# Altium footprint library chipfc_libs.PCBLIB: 283 footprints (part 8 of 18)
Each footprint in its own frame and in the unit in brackets; x right, y up, seen from the top. Pads: shape width x height; smd on the part's side, far side on the other; paste and mask are expansions set on the pad; w line width, h text height; cw(c..) or ccw(c..) is an arc to the next point about the centre after c.
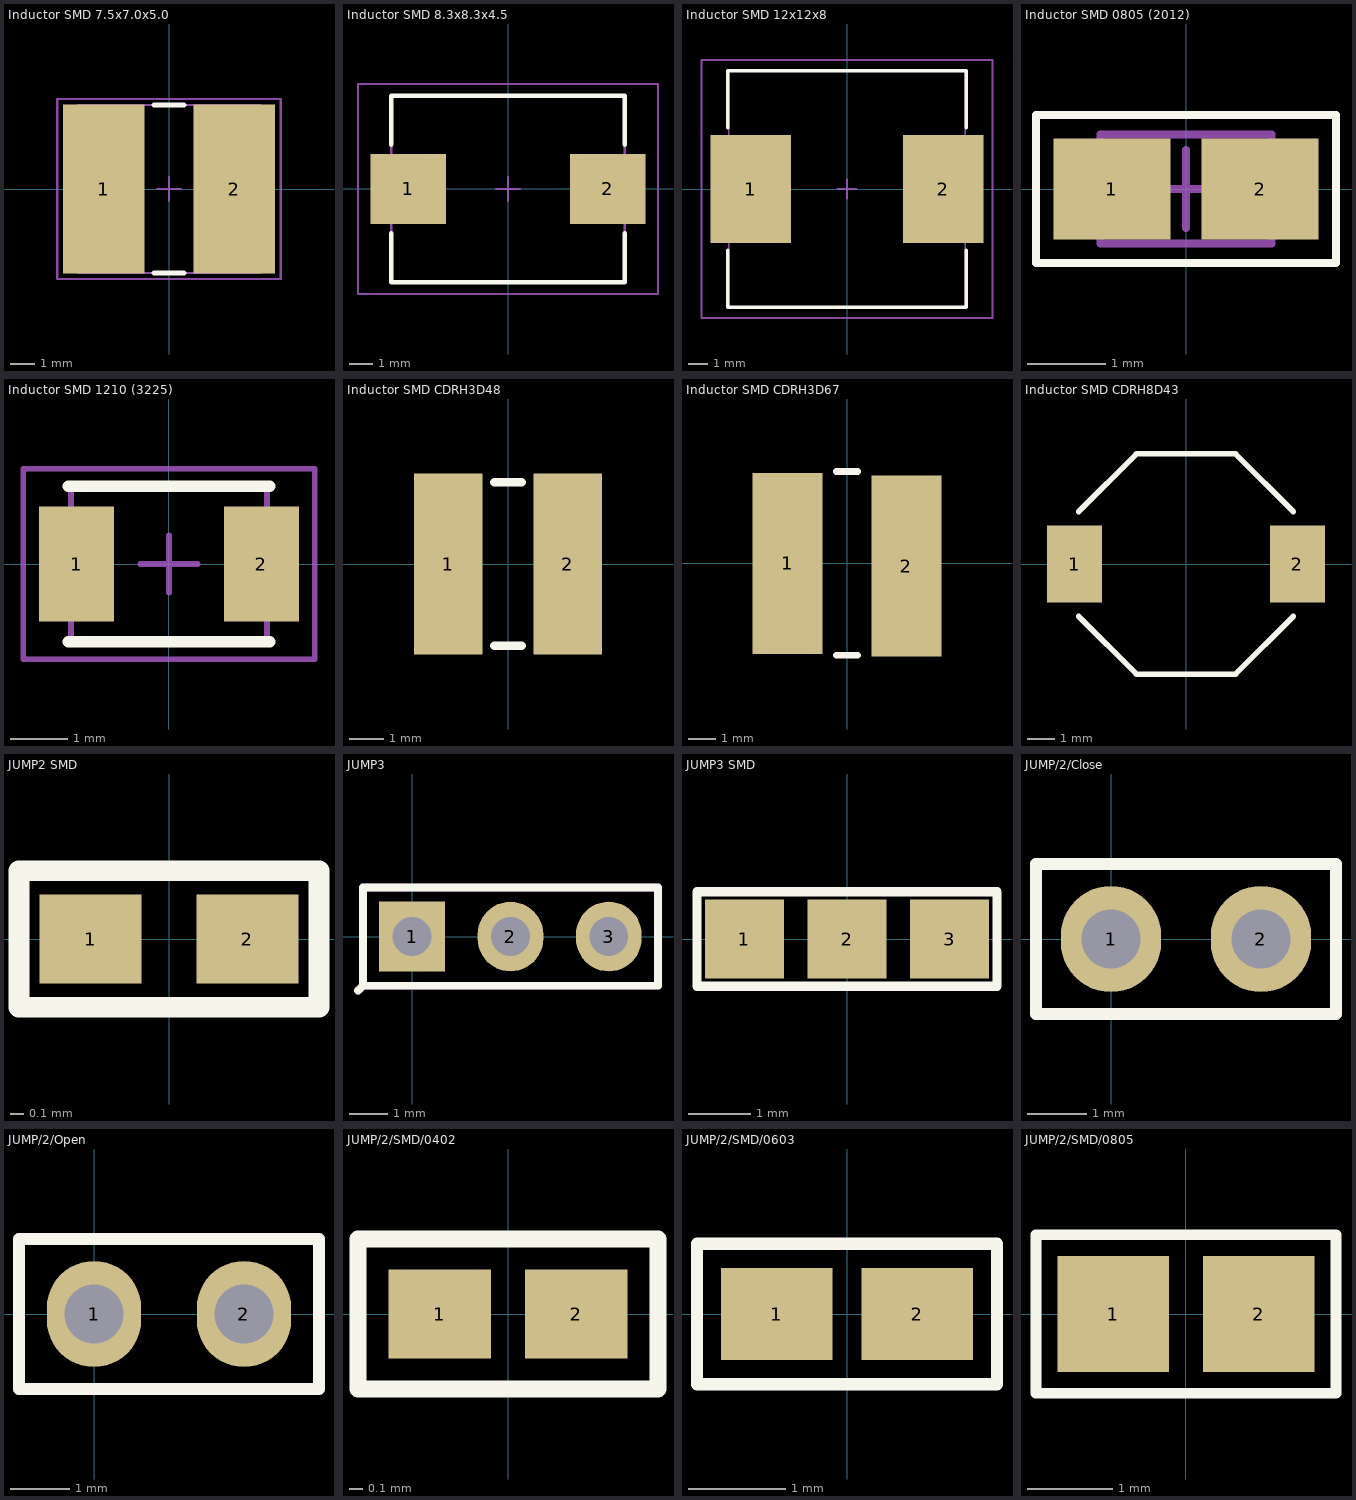
[diagram p7: the footprints below, top view; thin cyan lines are the x and y axes]

## Inductor SMD 7.5x7.0x5.0 [mm] "Precision Wire Wound Inductor, 2-Leads, Body 7.5x7.0mm, IPC Medium Density"
height 5
pads (2):
  rect 3.4x7.05 smd: 1(-2.725,0) 2(2.725,0)
Top Overlay:
  lines w0.2: -0.625,-3.5 0.625,-3.5 ; -0.625,3.5 0.625,3.5
Mechanical 13:
  lines w0.1: -3.8,-3.5 -3.8,3.5 3.8,3.5 3.8,-3.5 -3.8,-3.5
Mechanical 15:
  lines w0.1: -0.5,0 0.5,0 ; 0,-0.5 0,0.5 ; -4.65,-3.75 -4.65,3.75 4.65,3.75 4.65,-3.75 -4.65,-3.75
3D body: height 5, standoff 0, extent -3.77,-3.792 3.8,3.793

## Inductor SMD 8.3x8.3x4.5 [mm] "Precision Wire Wound Inductor, 2-Leads, Body 10.0x8.0mm, IPC Low Density"
height 4.5
pads (2):
  rect 3.25x3 smd: 1(-4.275,0) 2(4.275,0)
Top Overlay:
  lines w0.2: -5,-1.9 -5,-4 5,-4 5,-1.9 ; -5,1.9 -5,4 5,4 5,1.9
Mechanical 13:
  lines w0.1: -5,-4 5,-4 5,4 -5,4 -5,-4
Mechanical 15:
  lines w0.1: -0.5,0 0.5,0 ; 0,-0.5 0,0.5 ; -6.425,-4.5 6.425,-4.5 6.425,4.5 -6.425,4.5 -6.425,-4.5
3D body "User Library-inductor SDR0805.step": height 5.3, standoff 0, extent -3.9,-3.9 3.9,3.9

## Inductor SMD 12x12x8 [mm] "Precision Wire Wound Inductor, 2-Leads, Body 12.3x12.3mm, IPC Low Density"
height 8
pads (2):
  rect 4.2x5.6 smd: 1(-5,0) 2(5,0)
Top Overlay:
  lines w0.2: -6.2,-3.2 -6.2,-6.15 6.2,-6.15 6.2,-3.2 ; -6.2,3.2 -6.2,6.15 6.2,6.15 6.2,3.2
Mechanical 13:
  lines w0.1: -6.15,-6.15 -6.15,6.15 6.15,6.15 6.15,-6.15 -6.15,-6.15
Mechanical 15:
  lines w0.1: -0.5,0 0.5,0 ; 0,-0.5 0,0.5 ; -7.575,-6.7 -7.575,6.7 7.575,6.7 7.575,-6.7 -7.575,-6.7
3D body "User Library-DRQ127_12_5x12_5.step": height 8.01, standoff 0.01, extent -6.25,-6.25 6.25,6.25

## Inductor SMD 0805 (2012) [mm] "Precision Wire Wound Inductor, 2-Leads, Body 2.0x1.2mm, IPC Medium Density"
height 1
pads (2):
  rect 1.5x1.3 smd: 1(-0.95,0) 2(0.95,0)
Top Overlay:
  lines w0.1: -1.925,-0.95 1.925,-0.95 1.925,0.95 -1.925,0.95 -1.925,-0.95
Mechanical 13:
  lines w0.1: -1.1,-0.7 1.1,-0.7 1.1,0.7 -1.1,0.7 -1.1,-0.7
Mechanical 15:
  lines w0.1: -0.5,0 0.5,0 ; 0,-0.5 0,0.5 ; -1.925,-0.95 1.925,-0.95 1.925,0.95 -1.925,0.95 -1.925,-0.95
3D body "User Library-Chip Inductor (2).step": height 0.95, standoff 0, extent -1,-0.6 1,0.6

## Inductor SMD 1210 (3225) [mm] "Precision Wire Wound Inductor, 2-Leads, Body 3.2x2.5mm, IPC Medium Density"
height 2.4
pads (2):
  rect 1.3x2 smd: 1(-1.6,0) 2(1.6,0)
Top Overlay:
  lines w0.2: -1.75,-1.35 1.75,-1.35 ; -1.75,1.35 1.75,1.35
Mechanical 13:
  lines w0.1: -1.7,-1.35 -1.7,1.35 1.7,1.35 1.7,-1.35 -1.7,-1.35
Mechanical 15:
  lines w0.1: -0.5,0 0.5,0 ; 0,-0.5 0,0.5 ; -2.525,-1.65 -2.525,1.65 2.525,1.65 2.525,-1.65 -2.525,-1.65
3D body "User Library-Chip Inductor.step": height 1.35, standoff 0, extent -1.6,-1.25 1.6,1.25

## Inductor SMD CDRH3D48 [mm] "Precision Wire Wound Inductor, 2-Leads, Body 10.0x8.0mm, IPC Low Density"
height 4.5
pads (2):
  rect 2x5.3 smd: 1(-1.75,0) 2(1.75,0)
Top Overlay:
  lines w0.254: -0.4,-2.4 0.4,-2.4 ; -0.4,2.4 0.4,2.4
3D body "User Library-SDR0403.STEP": height 3.5, standoff 0, extent -2.25,-2.241 2.25,2.25

## Inductor SMD CDRH3D67 [mm] "Precision Wire Wound Inductor, 2-Leads, Body 10.0x8.0mm, IPC Low Density"
height 4.5
pads (2):
  rect 2.6x6.7 smd: 1(-2.2,0) 2(2.2,-0.1)
Top Overlay:
  lines w0.254: -0.4,-3.4 0.4,-3.4 ; -0.4,3.4 0.4,3.4
3D body "SUMIDA-CDRH6D28.step": height 2.9, standoff 0, extent -3.35,-3.35 3.35,3.35

## Inductor SMD CDRH8D43 [mm] "Precision Wire Wound Inductor, 2-Leads, Body 10.0x8.0mm, IPC Low Density"
height 4.5
pads (2):
  rect 2x2.8 smd: 1(-4.05,0) 2(4.05,0)
Top Overlay:
  lines w0.203: -3.9,-1.9 -1.8,-4 1.8,-4 3.9,-1.9 ; -3.9,1.9 -1.8,4 1.8,4 3.9,1.9
3D body "User Library-6mm radial ceramic disc capacitor.step": height 4.35, standoff 0, extent -5.657,-5.657 5.657,5.657

## JUMP2 SMD [mm]
pads (2):
  rect 0.75x0.65 smd: 1(-0.575,0) 2(0.575,0)
Top Overlay:
  lines w0.152: -1.1,-0.5 1.1,-0.5 1.1,0.5 -1.1,0.5 -1.1,-0.5

## JUMP3 [mm]
pads (3):
  rect 1.7x1.8 hole 1: 1(0,0)
  oval 1.7x1.8 hole 1: 2(2.54,0) 3(5.08,0)
Top Overlay:
  lines w0.203: -1.397,-1.397 -1.27,-1.27 ; -1.27,-1.27 -1.27,1.27 6.35,1.27 6.35,-1.27 -1.27,-1.27
Mechanical 1:
  lines w0.203: -1.397,-1.397 -1.27,-1.27 ; -1.27,-1.27 -1.27,1.27 6.35,1.27 6.35,-1.27 -1.27,-1.27
3D body "Samtec Header 3pin 2.54mm.STEP": height 8.89, standoff -2.03, extent -1.27,-1.27 6.35,1.27
3D body "User Library-SHORTING JUMPER.step": height 8.54, standoff 2.64, extent -1.27,-1.27 3.81,1.27

## JUMP3 SMD [mil]
pads (3):
  rect 50x50 smd: 1(-65,0) 2(0,0) 3(65,0)
Top Overlay:
  lines w6: -95,-30 -95,30 95,30 95,-30 -95,-30

## JUMP/2/Close [mm]
pads (2):
  oval 1.7x1.8 hole 1: 1(0,0) 2(2.54,0)
Top Overlay:
  lines w0.203: -1.27,-1.27 3.81,-1.27 3.81,1.27 -1.27,1.27 -1.27,-1.27
Mechanical 1:
  lines w0.203: -1.27,-1.27 3.81,-1.27 3.81,1.27 -1.27,1.27 -1.27,-1.27
3D body "User Library-SHORTING JUMPER.step": height 8.54, standoff 2.64, extent -1.27,-1.27 3.81,1.27
3D body "Samtec Header 2pin 2.54mm.STEP": height 8.89, standoff -2.03, extent -1.27,-1.27 3.81,1.27

## JUMP/2/Open [mm]
pads (2):
  oval 1.6x1.8 hole 1: 1(0,0) 2(2.54,0)
Top Overlay:
  lines w0.203: -1.27,-1.27 -1.27,1.27 3.81,1.27 3.81,-1.27 -1.27,-1.27
Mechanical 1:
  lines w0.203: -1.27,-1.27 -1.27,1.27 3.81,1.27 3.81,-1.27 -1.27,-1.27
3D body "Samtec Header 2pin 2.54mm.STEP": height 8.89, standoff -2.03, extent -1.27,-1.27 3.81,1.27

## JUMP/2/SMD/0402 [mm]
pads (2):
  rect 0.75x0.65 smd: 1(-0.5,0) 2(0.5,0)
Top Overlay:
  lines w0.127: -1.1,-0.55 -1.1,0.55 1.1,0.55 1.1,-0.55 -1.1,-0.55

## JUMP/2/SMD/0603 [mm] "Chip Resistor, 2-Leads, Body 1.6x0.8mm, IPC Medium Density"
height 0.55
pads (2):
  rect 1.15x0.95 smd: 1(-0.725,0) 2(0.725,0)
Top Overlay:
  lines w0.127: -1.55,-0.725 -1.55,0.725 1.55,0.725 1.55,-0.725 -1.55,-0.725

## JUMP/2/SMD/0805 [mm] "Chip Resistor, 2-Leads, Body 2.0x1.3mm, IPC Medium Density"
height 0.5
pads (2):
  rect 1.3x1.35 smd: 1(-0.85,0) 2(0.85,0)
Top Overlay:
  lines w0.127: -1.75,-0.925 1.75,-0.925 1.75,0.925 -1.75,0.925 -1.75,-0.925